# Altium footprint library Sirius.PcbLib: 58 footprints (part 3 of 4)
Each footprint in its own frame and in the unit in brackets; x right, y up, seen from the top. Pads: shape width x height; smd on the part's side, far side on the other; paste and mask are expansions set on the pad; w line width, h text height; cw(c..) or ccw(c..) is an arc to the next point about the centre after c.
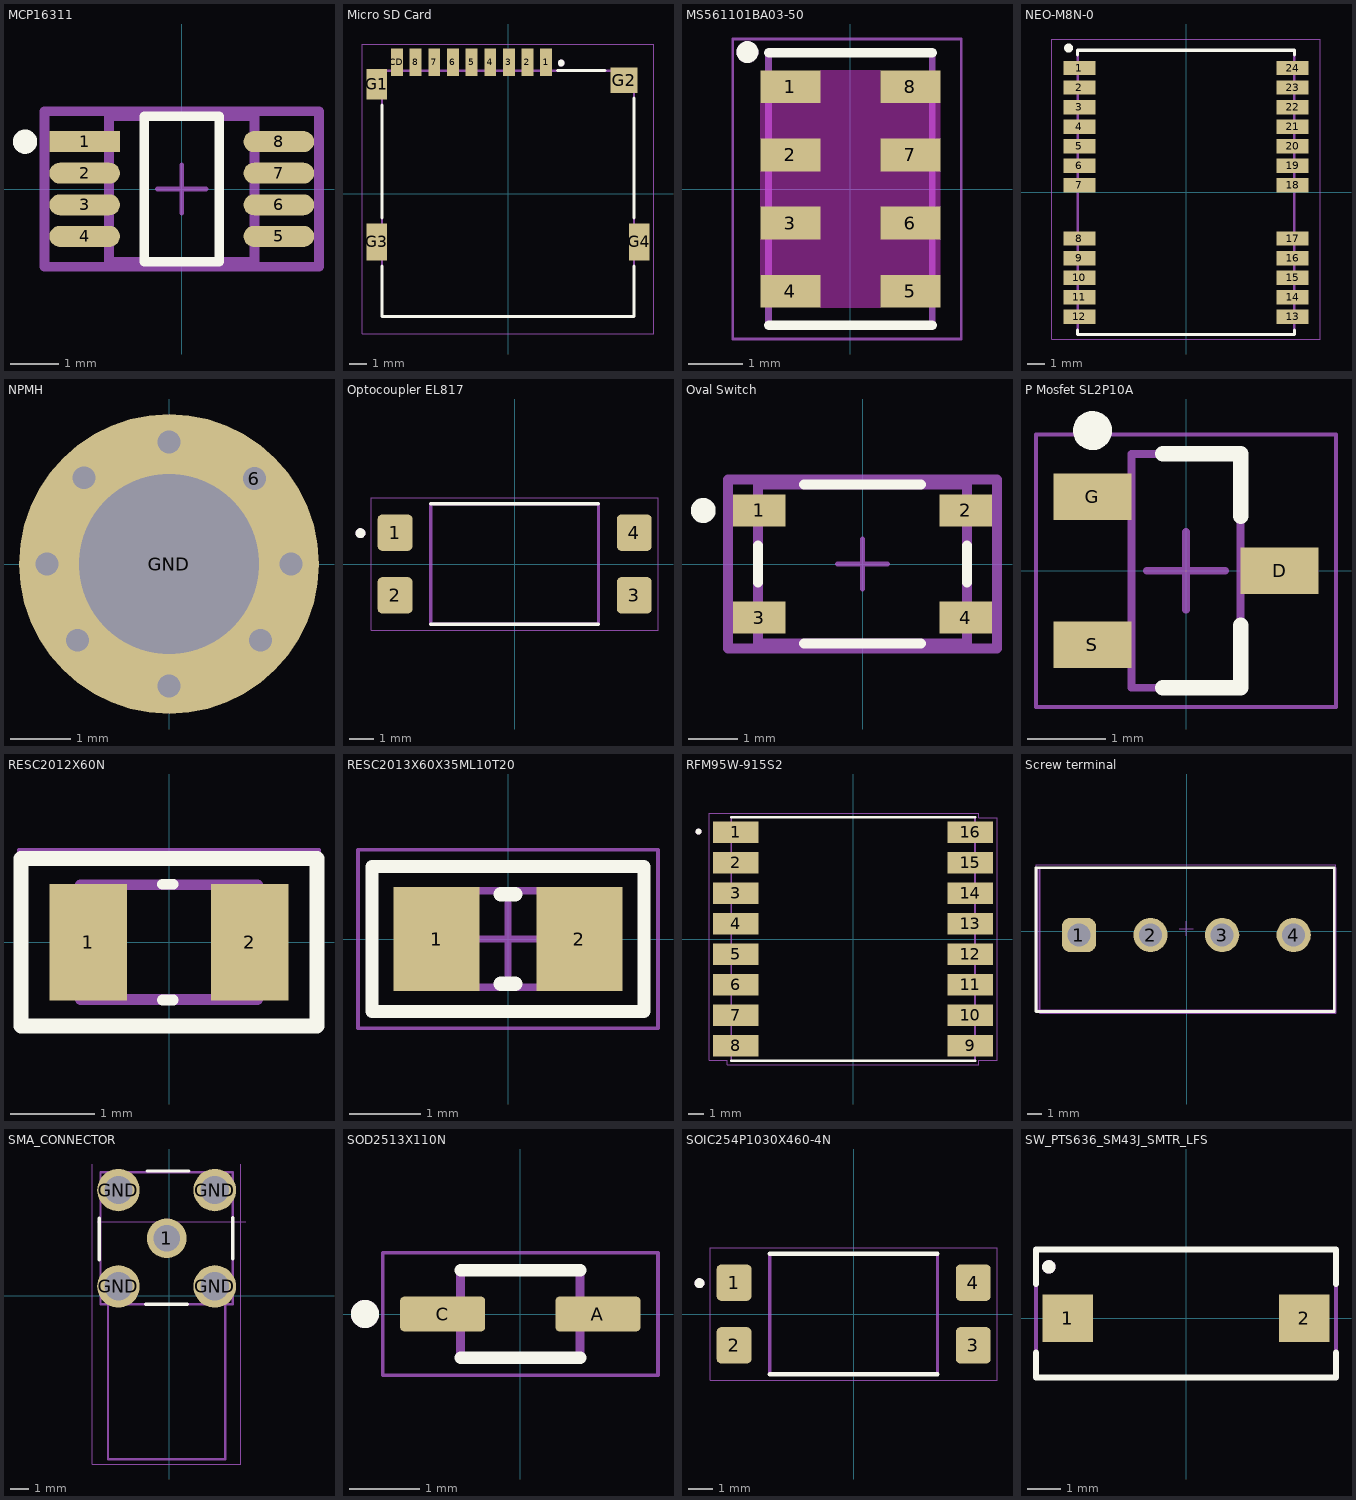
[diagram p2: the footprints below, top view; thin cyan lines are the x and y axes]

## MCP16311 [mm] "Switching Regulator"
pads (8):
  rect 1.454x0.433 smd paste+0 mask+0: 1(-2,0.975)
  rrect100% 1.454x0.433 smd paste+0 mask+0: 2(-2,0.325) 3(-2,-0.325) 4(-2,-0.975) 5(2,-0.975) 6(2,-0.325) 7(2,0.325) 8(2,0.975)
Top Overlay:
  circle w0.25: c-3.227,0.975 r0.125
  lines w0.2: -0.773,-1.5 0.773,-1.5 0.773,1.5 -0.773,1.5 -0.773,-1.5
Top 3D Body:
  lines w0.2: -1.5,-1.5 1.5,-1.5 1.5,1.5 -1.5,1.5 -1.5,-1.5
Top Courtyard:
  lines w0.2: -2.827,-1.6 2.827,-1.6 2.827,1.6 -2.827,1.6 -2.827,-1.6
Top Assembly:
  lines w0.2: -2.827,-1.6 2.827,-1.6 2.827,1.6 -2.827,1.6 -2.827,-1.6
Top Component Center:
  lines w0.1: -0.5,0 0.5,0 ; 0,-0.5 0,0.5
3D body "MCP16311-E_MS.STEP": height 1.1, standoff 0, extent -2.45,-1.5 2.45,1.5

## Micro SD Card [mm]
height 2
pads (13):
  rect 0.7x1.6 smd: 1(2.25,7.75) 2(1.15,7.75) 3(0.05,7.75) 4(-1.05,7.75) 5(-2.15,7.75) 6(-3.25,7.75) 7(-4.35,7.75) 8(-5.45,7.75) CD(-6.55,7.75)
  rect 1.2x1.8 smd: G1(-7.75,6.45)
  rect 1.6x1.5 smd: G2(6.85,6.7)
  rect 1.2x2.2 smd: G3(-7.75,-2.85) G4(7.75,-2.85)
Top Overlay:
  circle w0.2: c3.139,7.703 r0.1
  lines w0.178: -7.425,-4.27 -7.425,-7.25 7.425,-7.25 7.425,-4.27 ; -7.425,-1.43 -7.425,5.23 ; 2.92,7.25 5.73,7.25 ; 7.425,-1.43 7.425,5.63
Mechanical 13:
  circle w0.2: c3.139,7.703 r0.1
  lines w0.127: -7.425,-7.25 -6.45,-7.25 4.55,-7.25 7.425,-7.25 7.425,7.25 -7.425,7.25 -7.425,-7.25
Mechanical 15:
  lines w0.05: -8.6,-8.255 -8.6,8.8 8.6,8.8 8.6,-8.255 -8.6,-8.255
3D body "Micro SD Card.STEP": height 1.8, standoff -0.6, extent -8.025,-7.3 8.125,7.75

## MS561101BA03-50 [mm]
height 1.1
pads (8):
  rect 1.1x0.6 smd: 1(-1.1,1.875) 2(-1.1,0.625) 3(-1.1,-0.625) 4(-1.1,-1.875) 5(1.1,-1.875) 6(1.1,-0.625) 7(1.1,0.625) 8(1.1,1.875)
Top Overlay:
  circle w0.2: c-1.888,2.51 r0.1
  lines w0.127: -1.5,-2.5 -1.5,-2.495 ; -1.5,2.495 -1.5,2.5 ; 1.5,-2.5 1.5,-2.495 ; 1.5,2.495 1.5,2.5
  lines w0.178: -1.5,-2.5 1.5,-2.5 ; -1.5,2.5 1.5,2.5
Keep-Out Layer:
  region: 0.55,1.575 1.65,1.575 1.65,0.925 0.55,0.925 0.55,0.325 1.65,0.325 1.65,-0.325 0.55,-0.325 0.55,-0.925 1.65,-0.925 1.65,-1.575 0.55,-1.575 0.55,-2.175 -0.55,-2.175 -0.55,-1.575 -1.65,-1.575 -1.65,-0.925 -0.55,-0.925 -0.55,-0.325 -1.65,-0.325 -1.65,0.325 -0.55,0.325 -0.55,0.925 -1.65,0.925 -1.65,1.575 -0.55,1.575 -0.55,2.175 0.55,2.175
Mechanical 13:
  lines w0.127: -1.5,-2.5 1.5,-2.5 1.5,2.5 -1.5,2.5 -1.5,-2.5
  lines w0.2: -1.809,2.572 ccw(c-1.888,2.51) -1.788,2.51
Mechanical 15:
  lines w0.05: -2.159,-2.75 2.032,-2.75 2.032,2.75 -2.159,2.75 -2.159,-2.75
3D body "step_temp.STEP": height 1, standoff 0, extent -1.5,-2.5 1.5,2.5

## NEO-M8N-0 [mm]
pads (24):
  rect 1.8x0.8 smd paste-2: 1(-6,7) 2(-6,5.9) 3(-6,4.8) 4(-6,3.7) 5(-6,2.6) 6(-6,1.5) 7(-6,0.4) 8(-6,-2.6) 9(-6,-3.7) 10(-6,-4.8) 11(-6,-5.9) 12(-6,-7) 13(6,-7) 14(6,-5.9) 15(6,-4.8) 16(6,-3.7) 17(6,-2.6) 18(6,0.4) 19(6,1.5) 20(6,2.6) 21(6,3.7) 22(6,4.8) 23(6,5.9) 24(6,7)
Top Overlay:
  circle w0.3: c-6.604,8.128 r0.1
  lines w0.178: -6.1,-7.75 -6.1,-8 6.1,-8 6.1,-7.75 ; -6.1,7.75 -6.1,8 6.1,8 6.1,7.75
Top Paste:
  drawing of 48 lines, arcs and shapes, not listed
Mechanical 13:
  lines w0.127: -6.1,-8 -6.1,8 6.1,8 6.1,-8 -6.1,-8
Mechanical 15:
  lines w0.05: -7.55,-8.25 -7.55,8.636 7.55,8.636 7.55,-8.25 -7.55,-8.25
3D body "NEO-M8N-0.STEP": height 2.6, standoff 0, extent -6.1,-8 6.1,8

## NPMH [mil] "3.5mm"
pads (2):
  round 20 hole 15 unplated: 6(56,56)
  round 196.85 hole 118.11: GND(0,0)
via 0,80 diameter 20 hole 15
via 0,-80 diameter 20 hole 15
via -55.84,56.58 diameter 20 hole 15
via -80,0 diameter 20 hole 15
via 80,0 diameter 20 hole 15
via 60,-50 diameter 20 hole 15
via -60,-50 diameter 20 hole 15
via 56,56 diameter 20 hole 15

## Optocoupler EL817 [mm] "Optocoupler EL817"
pads (4):
  rrect25% 1.41x1.47 smd: 1(-4.85,1.27) 2(-4.85,-1.27) 3(4.85,-1.27) 4(4.85,1.27)
Top Overlay:
  circle w0.2: c-6.25,1.25 r0.1
  lines w0.127: -3.4,-2.44 3.4,-2.44 ; -3.4,2.44 3.4,2.44
Mechanical 13:
  circle w0.2: c-6.25,1.25 r0.1
  lines w0.127: -3.4,-2.44 -3.4,2.44 3.4,2.44 3.4,-2.44 -3.4,-2.44
Mechanical 15:
  lines w0.05: -5.81,-2.69 5.81,-2.69 5.81,2.69 -5.81,2.69 -5.81,-2.69
3D body "step_temp.STEP": height 4.8, standoff -2.75, extent -3.935,-2.29 3.935,2.29

## Oval Switch [mm] "FP-PTS810_SJG_250_SMTR_LF-MFG"
pads (4):
  rect 1.05x0.65 smd paste+0 mask+0: 1(-2.075,1.075) 2(2.075,1.075) 3(-2.075,-1.075) 4(2.075,-1.075)
Top Overlay:
  circle w0.25: c-3.2,1.075 r0.125
  lines w0.2: -2.1,-0.375 -2.1,0.375 ; -1.175,-1.6 1.175,-1.6 ; -1.175,1.6 1.175,1.6 ; 2.1,-0.375 2.1,0.375
Top 3D Body:
  lines w0.2: -2.1,-1.6 -2.1,1.6 2.1,1.6 2.1,-1.6 -2.1,-1.6
Top Courtyard:
  lines w0.2: -2.7,-1.7 -2.7,1.7 2.7,1.7 2.7,-1.7 -2.7,-1.7
Top Assembly:
  lines w0.2: -2.7,-1.7 -2.7,1.7 2.7,1.7 2.7,-1.7 -2.7,-1.7
Top Component Center:
  lines w0.1: -0.5,0 0.5,0 ; 0,-0.5 0,0.5
3D body "Switch_C&K_Components_PTS810_SJG_250_SMTR_LFS_eec.STEP": height 0.25, standoff 0, extent -2.7,-1.7 2.7,1.7

## P Mosfet SL2P10A [mm] "SOT23, 3-Leads, Body 2.90x2.45mm, Pitch 0.95mm, IPC Medium Density"
height 0.9
pads (3):
  rect 1x0.6 smd: D(1.2,0) G(-1.2,0.95) S(-1.2,-0.95)
Top Overlay:
  circle w0.25: c-1.2,1.8 r0.125
  lines w0.2: -0.3,-1.5 0.7,-1.5 0.7,-0.7 ; -0.3,1.5 0.7,1.5 0.7,0.7
Top Courtyard:
  lines w0.05: -1.925,-1.75 -1.925,1.75 1.925,1.75 1.925,-1.75 -1.925,-1.75
  lines w0.1: -0.5,0 0.5,0 ; 0,-0.5 0,0.5
Top Assembly:
  lines w0.1: -0.7,-1.5 -0.7,1.5 0.7,1.5 0.7,-1.5 -0.7,-1.5
3D body "p mosfet.STEP": height 1.12, standoff 0, extent -1.185,-1.46 1.185,1.46

## RESC2012X60N [mm] "0805"
pads (2):
  rect 0.92x1.38 smd: 1(-0.955,0) 2(0.955,0)
Top Overlay:
  lines w0.127: -0.076,-0.686 0.051,-0.686 ; -0.076,0.686 0.051,0.686
  lines w0.178: -1.753,-0.991 -1.753,0.991 1.753,0.991 1.753,-0.991 -1.753,-0.991
Mechanical 13:
  lines w0.127: -1.05,-0.68 1.05,-0.68 1.05,0.68 -1.05,0.68 -1.05,-0.68
Mechanical 15:
  lines w0.05: -1.778,-1.016 1.778,-1.016 1.778,1.092 -1.778,1.092 -1.778,-1.016
3D body "RC0805FR-075K1L.step": height 0.6, standoff 0, extent -1,-0.574 1,0.676

## RESC2013X60X35ML10T20 [mm] "10k Chip Resistor, 2-Leads, Body 2.1x1.35mm, IPC Low Density"
height 0.6
pads (2):
  rect 1.2x1.45 smd: 1(-1,0) 2(1,0)
Top Overlay:
  lines w0.178: -1.905,-1.016 -1.905,1.016 1.905,1.016 1.905,-1.016 -1.905,-1.016
  lines w0.2: -0.1,-0.625 0.1,-0.625 ; -0.1,0.625 0.1,0.625
Mechanical 13:
  lines w0.1: -1.05,-0.675 -1.05,0.675 1.05,0.675 1.05,-0.675 -1.05,-0.675
Mechanical 15:
  lines w0.05: -2.1,-1.25 -2.1,1.25 2.1,1.25 2.1,-1.25 -2.1,-1.25
  lines w0.1: -0.5,0 0.5,0 ; 0,-0.5 0,0.5
3D body "RESC2012X06N.step": height 0.6, standoff 0, extent -1.05,-0.675 1.05,0.675

## RFM95W-915S2 [mm]
pads (16):
  rect 3x1.4 smd: 1(-7.7,7) 2(-7.7,5) 3(-7.7,3) 4(-7.7,1) 5(-7.7,-1) 6(-7.7,-3) 7(-7.7,-5) 8(-7.7,-7) 9(7.7,-7) 10(7.7,-5) 11(7.7,-3) 12(7.7,-1) 13(7.7,1) 14(7.7,3) 15(7.7,5) 16(7.7,7)
Top Overlay:
  circle w0.2: c-10.15,7.05 r0.1
  lines w0.178: -8,-8 8,-8 ; -8,8 8,8
Mechanical 13:
  circle w0.2: c-10.15,7.05 r0.1
  lines w0.127: -8,-8 -8,8 8,8 8,-8 -8,-8
Mechanical 15:
  lines w0.05: -9.45,-7.95 -8.25,-7.95 -8.25,-8.25 8.25,-8.25 8.25,-7.95 9.45,-7.95 9.45,7.95 8.25,7.95 8.25,8.25 -8.25,8.25 -9.45,8.25 -9.45,-7.95
3D body "RFM95W-915S2--3DModel-STEP-56544.STEP": height 1.8, standoff 0, extent -8,-8 8,8

## Screw terminal [mm] "5.08 pitch"
pads (4):
  rrect50% 2.4x2.4 hole 1.6: 1(-7.541,-0.258)
  round 2.4 hole 1.6: 2(-2.541,-0.258) 3(2.459,-0.258) 4(7.459,-0.258)
Top Overlay:
  lines w0.2: -10.541,-5.588 10.287,-5.588 10.287,4.442 -10.541,4.442 -10.541,-5.588
Top 3D Body:
  lines w0.1: -10.287,-5.715 -10.287,4.442 10.414,4.442 10.414,-5.715 -10.287,-5.715
Top Designator:
  lines w0.05: -10.541,-5.461 10.414,-5.461 10.414,4.642 -10.541,4.642 -10.541,-5.461
Top Component Outline:
  lines w0.1: -10.414,-5.588 10.287,-5.588 10.287,4.442 -10.414,4.442 -10.414,-5.588
Bottom Courtyard:
  lines w0.05: -0.541,0.192 0.459,0.192 ; -0.041,-0.308 -0.041,0.692
3D body "screw terminal 4 pin.stp": height 13.8, standoff -3.5, extent -10.16,-5.334 10.16,4.466

## SMA_CONNECTOR [mm]
height 8.3
pads (5):
  round 2.1 hole 1.4: 1(-0.127,3.048)
  round 2.25 hole 1.5: GND(-2.677,0.498) GND(-2.677,5.598) GND(2.423,0.498) GND(2.423,5.598)
Top Overlay:
  lines w0.178: -3.683,1.905 -3.683,4.105 ; -1.227,-0.452 0.973,-0.452 ; -1.143,6.604 1.057,6.604 ; 3.373,1.948 3.373,4.148
Mechanical 13:
  lines w0.127: -3.227,-0.452 2.973,-0.452 ; -3.227,-0.452 -3.627,-0.452 -3.627,6.548 3.373,6.548 3.373,-0.452 2.973,-0.452 ; -3.227,-0.452 -3.227,-8.652 2.973,-8.652 2.973,-0.452
Mechanical 15:
  lines w0.05: -4.057,6.978 -4.057,-8.902 3.803,-8.902 3.803,6.978 ; -3.803,3.93 4.057,3.93
3D body "step_temp.STEP": height 10, standoff -3.9, extent -3.754,-8.616 3.246,6.584

## SOD2513X110N [mm]
pads (2):
  rrect25% 1.21x0.5 smd: A(1.105,0) C(-1.105,0)
Top Overlay:
  circle w0.2: c-2.21,0 r0.1
  lines w0.178: -0.85,-0.625 0.85,-0.625 ; -0.85,0.625 0.85,0.625
Mechanical 13:
  circle w0.2: c-2.21,0 r0.1
  lines w0.127: -0.85,-0.625 0.85,-0.625 0.85,0.625 -0.85,0.625 -0.85,-0.625
Mechanical 15:
  lines w0.05: -1.96,-0.875 1.96,-0.875 1.96,0.875 -1.96,0.875 -1.96,-0.875
3D body "schottky sod323.STEP": height 1.1, standoff 0, extent -1.25,-0.625 1.25,0.625

## SOIC254P1030X460-4N [mm]
pads (4):
  rrect25% 1.41x1.47 smd: 1(-4.85,1.27) 2(-4.85,-1.27) 3(4.85,-1.27) 4(4.85,1.27)
Top Overlay:
  circle w0.2: c-6.25,1.25 r0.1
  lines w0.178: -3.4,-2.44 3.4,-2.44 ; -3.4,2.44 3.4,2.44
Mechanical 13:
  circle w0.2: c-6.25,1.25 r0.1
  lines w0.127: -3.4,-2.44 -3.4,2.44 3.4,2.44 3.4,-2.44 -3.4,-2.44
Mechanical 15:
  lines w0.05: -5.81,-2.69 5.81,-2.69 5.81,2.69 -5.81,2.69 -5.81,-2.69
3D body "step_temp.STEP": height 4.8, standoff -2.75, extent -3.935,-2.29 3.935,2.29

## SW_PTS636_SM43J_SMTR_LFS [mm]
pads (2):
  rect 1.5x1.4 smd: 1(-3.5,0) 2(3.5,0)
Top Overlay:
  circle w0.2: c-4.064,1.524 r0.1
  lines w0.178: -4.445,-1.014 -4.445,-1.75 4.445,-1.75 4.445,-1.014 ; -4.445,1.014 -4.445,2.032 4.445,2.032 4.445,1.014
Mechanical 13:
  circle w0.2: c-4.064,1.524 r0.1
  lines w0.127: -4.445,-1.75 4.445,-1.75 4.445,2.032 -4.445,2.032 -4.445,-1.75
Mechanical 15:
  lines w0.05: -4.445,-1.778 4.445,-1.778 4.445,2 -4.445,2 -4.445,-1.778
3D body "Switch PTS636 SM43J SMTR LFS.STEP": height 4.3, standoff 0, extent -3.55,-1.623 3.55,1.877